# Altium footprint library ACTION_插件.PcbLib: 118 footprints (part 4 of 8)
Each footprint in its own frame and in the unit in brackets; x right, y up, seen from the top. Pads: shape width x height; smd on the part's side, far side on the other; paste and mask are expansions set on the pad; w line width, h text height; cw(c..) or ccw(c..) is an arc to the next point about the centre after c.
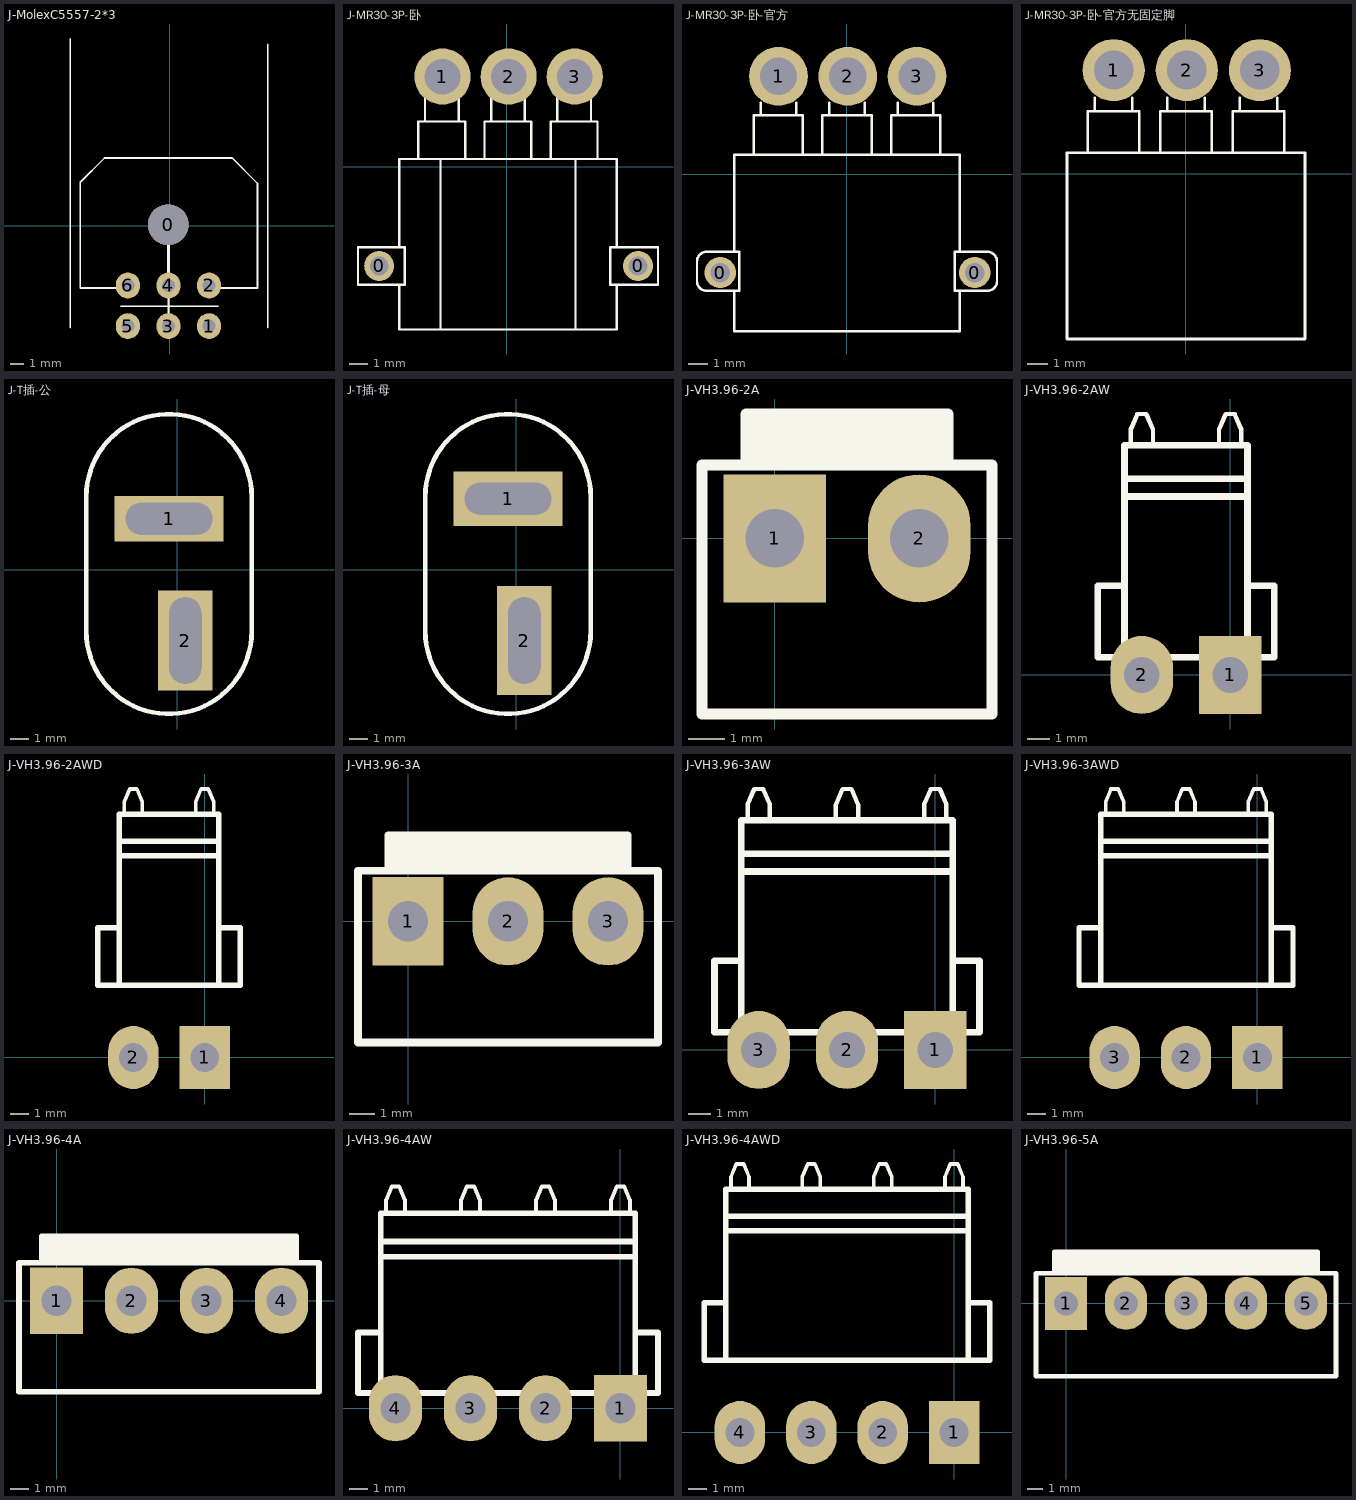
[diagram p3: the footprints below, top view; thin cyan lines are the x and y axes]

## J-MolexС5557-2*3 [mil]
pads (7):
  round 118.11 hole 118.11: 0(-4.72,3.7)
  oval 70x75.06 hole 38: 1(114.37,-291.3) 2(114.37,-173.19) 3(-3.72,-291.3) 4(-3.72,-173.19) 5(-121.83,-291.3) 6(-121.83,-173.19)
Top Overlay:
  lines w5: -289.72,-296.3 -289.72,543.7 ; -260.72,-180.3 -119.72,-180.3 -92.29,-180.3 ; -260.72,-177.3 -260.72,126.7 -189.72,197.7 75.28,197.7 ; -142.72,-233.3 140.28,-233.3 ; -3.72,-300.3 -3.72,-173.19 ; 74.28,197.7 75.28,197.7 ; 114.37,-180.3 255.37,-180.3 255.37,123.61 181.28,197.7 75.28,197.7 ; 285.28,-296.3 285.28,528.7
  lines w10: -3.72,-173.19 -3.72,-0.3

## J-MR30-3P-卧 [mm]
pads (5):
  round 1.6 hole 1: 0(-6.807,-5.309) 0(7.01,-5.309)
  round 3 hole 1.9: 1(-3.429,4.801) 2(0.102,4.801) 3(3.632,4.801)
Top Overlay:
  lines w0.127: -5.737,-6.3 -5.737,-8.7 -3.532,-8.7 ; -5.737,-4.3 -5.737,-0.7 -5.737,0.4 -3.532,0.4 ; -4.714,0.4 -4.714,2.4 -3.464,2.4 -2.214,2.4 -2.214,0.4 ; -4.364,2.4 -4.364,4.889 ; -2.564,2.4 -2.564,4.889 ; -1.184,0.4 -1.184,2.4 0.066,2.4 1.316,2.4 1.316,0.4 ; -0.834,2.4 -0.834,4.889 ; 0.966,2.4 0.966,4.889 ; 2.346,0.4 2.346,2.4 3.596,2.4 4.846,2.4 4.846,0.4 ; 2.696,2.4 2.696,4.889 ; 4.496,2.4 4.496,4.889 ; 5.873,-6.3 5.873,-8.7 3.668,-8.7 ; 5.873,-4.3 5.873,-0.7 5.873,0.4 3.668,0.4 ; -3.532,-8.7 -3.532,-1.63 -3.532,0 -3.532,0.4 ; -3.532,-8.7 3.668,-8.7 ; -3.532,0.4 3.668,0.4 ; 3.668,-8.7 3.668,-1.63 3.668,0 3.668,0.4 ; -7.937,-6.3 -7.937,-4.3 -5.446,-4.3 -5.446,-6.3 -7.937,-6.3 ; 5.521,-6.3 8.073,-6.3 8.073,-4.3 5.521,-4.3 5.521,-6.3
3D body "User Library-MR30PW-M.STEP": height 4.95, standoff -2.01, extent -7.933,-8.743 8.077,5.746

## J-MR30-3P-卧-官方 [mm]
pads (5):
  round 1.6 hole 1: 0(-6.452,-5.004) 0(6.528,-5.004)
  round 3 hole 1.9: 1(-3.48,5.004) 2(0.051,5.004) 3(3.581,5.004)
Top Overlay:
  circle w0.127: c-6.487,-4.939 r0.55
  circle w0.127: c6.513,-4.939 r0.55
  circle w0.127: c-6.487,-4.939 r0.5
  circle w0.127: c6.513,-4.939 r0.5
  lines w0.127: -5.737,-5.939 -5.737,-7.989 -3.487,-7.989 3.513,-7.989 5.763,-7.989 5.763,-5.939 ; -5.737,-3.939 -5.737,0.011 -5.737,1.011 -3.487,1.011 3.513,1.011 5.763,1.011 5.763,0.011 5.763,-3.939 ; -4.737,1.011 -4.737,3.011 -2.237,3.011 -2.237,1.011 ; -4.387,3.011 -4.387,3.661 ; -2.587,3.011 -2.587,3.661 ; -1.237,1.011 -1.237,3.011 1.263,3.011 1.263,1.011 ; -0.887,3.011 -0.887,3.661 ; 0.913,3.011 0.913,3.661 ; 2.263,1.011 2.263,3.011 4.763,3.011 4.763,1.011 ; 2.613,3.011 2.613,3.661 ; 4.413,3.011 4.413,3.661 ; -7.637,-5.439 ccw(c-7.137,-5.439) -7.137,-5.939 -5.477,-5.939 -5.477,-3.939 -7.137,-3.939 ccw(c-7.137,-4.439) -7.637,-4.439 -7.637,-5.439 ; 5.503,-5.939 7.163,-5.939 ccw(c7.163,-5.439) 7.663,-5.439 7.663,-4.439 ccw(c7.163,-4.439) 7.163,-3.939 5.503,-3.939 5.503,-5.939
3D body "MR30PW-M 3D DRAWING.STEP": height 5.1, standoff -1.85, extent -7.604,-8.016 7.696,5.934

## J-MR30-3P-卧-官方无固定脚 [mm]
pads (3):
  round 3 hole 1.9: 1(-3.48,5.004) 2(0.051,5.004) 3(3.581,5.004)
Top Overlay:
  lines w0.127: -5.737,-6.096 -5.737,0.011 -5.737,1.011 -3.487,1.011 3.513,1.011 5.763,1.011 5.763,0.011 5.763,-5.918 ; -5.737,-5.939 -5.737,-7.989 -3.487,-7.989 3.513,-7.989 5.763,-7.989 5.763,-5.939 ; -4.737,1.011 -4.737,3.011 -2.237,3.011 -2.237,1.011 ; -4.387,3.011 -4.387,3.661 ; -2.587,3.011 -2.587,3.661 ; -1.237,1.011 -1.237,3.011 1.263,3.011 1.263,1.011 ; -0.887,3.011 -0.887,3.661 ; 0.913,3.011 0.913,3.661 ; 2.263,1.011 2.263,3.011 4.763,3.011 4.763,1.011 ; 2.613,3.011 2.613,3.661 ; 4.413,3.011 4.413,3.661
3D body "MR30PW-M 3D DRAWING 214.STEP": height 5.1, standoff -1.85, extent -7.68,-8.001 7.62,5.949

## J-T插-公 [mm]
pads (2):
  rect 6x2.5 hole 1.778 slot 4.775 at 0 deg: 1(-0.45,2.8)
  rect 3x5.5 hole 1.778 slot 4.775 at 90 deg: 2(0.45,-3.9)
Top Overlay:
  lines w0.254: -5,-3.39 ccw(c-0.45,-3.39) 4.1,-3.39 4.1,4.01 ccw(c-0.45,4.01) -5,4.01 -5,-3.39
3D body "装配体2.STEP": height 11.35, standoff -3.75, extent -4.497,-7.468 3.303,8.932

## J-T插-母 [mm]
pads (2):
  rect 6x3 hole 1.778 slot 4.775 at 0 deg: 1(-0.45,3.9)
  rect 3x6 hole 1.778 slot 4.775 at 90 deg: 2(0.45,-3.9)
Top Overlay:
  lines w0.254: -5,-3.39 ccw(c-0.45,-3.39) 4.1,-3.39 4.1,4.01 ccw(c-0.45,4.01) -5,4.01 -5,-3.39
3D body "装配体2.STEP": height 11.35, standoff -3.75, extent -4.497,-7.468 3.303,8.932

## J-VH3.96-2A [mm]
pads (2):
  rect 2.8x3.5 hole 1.6: 1(0,0)
  oval 2.8x3.5 hole 1.6: 2(3.96,0)
Top Overlay:
  lines w0.3: -0.78,2 -0.78,3.4 4.74,3.4 4.74,2 ; -0.78,2.286 4.74,2.286 ; -0.78,2.413 4.74,2.413 ; -0.78,2.667 4.74,2.667 ; -0.78,2.921 4.74,2.921 ; -0.78,3.175 4.74,3.175 ; -1.98,-4.8 5.94,-4.8 5.94,2 -1.98,2 -1.98,-4.8
3D body "VH3.96-2A.STEP": height 14.6, standoff -3.6, extent -1.98,-4.8 5.94,3.6

## J-VH3.96-2AW [mm]
pads (2):
  rect 2.8x3.5 hole 1.6: 1(0,0)
  oval 2.8x3.5 hole 1.6: 2(-3.96,0)
Top Overlay:
  lines w0.2: -4.46,10.3 -4.46,11 -4.16,11.7 -3.76,11.7 -3.46,11 -3.46,10.3 ; -0.5,10.3 -0.5,11 -0.2,11.7 0.2,11.7 0.5,11 0.5,10.3
  lines w0.3: -4.74,0.8 -4.74,10.3 0.78,10.3 0.78,0.8 ; -4.74,4 -5.94,4 -5.94,0.8 1.98,0.8 1.98,4 0.78,4 ; -4.74,8 0.78,8 ; -4.74,8.8 0.78,8.8
3D body "VH3.96-2AW.STEP": height 8.4, standoff -3.6, extent -5.94,-0.55 1.98,11.7

## J-VH3.96-2AWD [mm]
pads (2):
  rect 2.8x3.5 hole 1.6: 1(0,0)
  oval 2.8x3.5 hole 1.6: 2(-3.96,0)
Top Overlay:
  lines w0.2: -4.46,13.5 -4.46,14.2 -4.16,14.9 -3.76,14.9 -3.46,14.2 -3.46,13.5 ; -0.5,13.5 -0.5,14.2 -0.2,14.9 0.2,14.9 0.5,14.2 0.5,13.5
  lines w0.3: -4.74,4 -4.74,13.5 0.78,13.5 0.78,4 ; -4.74,7.2 -5.94,7.2 -5.94,4 1.98,4 1.98,7.2 0.78,7.2 ; -4.74,11.2 0.78,11.2 ; -4.74,12 0.78,12
3D body "VH3.96-2AWD.STEP": height 8.4, standoff -3.6, extent -5.94,-0.55 1.98,14.9

## J-VH3.96-3A [mm]
pads (3):
  rect 2.8x3.5 hole 1.6: 1(0,0)
  oval 2.8x3.5 hole 1.6: 2(3.96,0) 3(7.92,0)
Top Overlay:
  lines w0.3: -0.78,2 -0.78,3.4 8.7,3.4 8.7,2 ; -0.78,2.286 8.7,2.286 ; -0.78,2.413 8.7,2.413 ; -0.78,2.667 8.7,2.667 ; -0.78,2.921 8.7,2.921 ; -0.78,3.175 8.7,3.175 ; -1.98,-4.8 -1.98,2 9.9,2 9.9,-4.8 -1.98,-4.8
3D body "VH3.96-3A.STEP": height 14.6, standoff -3.6, extent -1.98,-4.8 9.9,3.6

## J-VH3.96-3AW [mm]
pads (3):
  rect 2.8x3.5 hole 1.6: 1(0,0)
  oval 2.8x3.5 hole 1.6: 2(-3.96,0) 3(-7.92,0)
Top Overlay:
  lines w0.2: -8.42,10.3 -8.42,11 -8.12,11.7 -7.72,11.7 -7.42,11 -7.42,10.3 ; -4.46,10.3 -4.46,11 -4.16,11.7 -3.76,11.7 -3.46,11 -3.46,10.3 ; -0.5,10.3 -0.5,11 -0.2,11.7 0.2,11.7 0.5,11 0.5,10.3
  lines w0.3: -8.7,0.8 -8.7,10.3 0.78,10.3 0.78,0.8 ; -8.7,4 -9.9,4 -9.9,0.8 1.98,0.8 1.98,4 0.78,4 ; -8.7,8 0.78,8 ; -8.7,8.8 0.78,8.8
3D body "VH3.96-3AW.STEP": height 8.4, standoff -3.6, extent -9.9,-0.55 1.98,11.7

## J-VH3.96-3AWD [mm]
pads (3):
  rect 2.8x3.5 hole 1.6: 1(0,0)
  oval 2.8x3.5 hole 1.6: 2(-3.96,0) 3(-7.92,0)
Top Overlay:
  lines w0.2: -8.42,13.5 -8.42,14.2 -8.12,14.9 -7.72,14.9 -7.42,14.2 -7.42,13.5 ; -4.46,13.5 -4.46,14.2 -4.16,14.9 -3.76,14.9 -3.46,14.2 -3.46,13.5 ; -0.5,13.5 -0.5,14.2 -0.2,14.9 0.2,14.9 0.5,14.2 0.5,13.5
  lines w0.3: -8.7,4 -8.7,13.5 0.78,13.5 0.78,4 ; -8.7,7.2 -9.9,7.2 -9.9,4 1.98,4 1.98,7.2 0.78,7.2 ; -8.7,11.2 0.78,11.2 ; -8.7,12 0.78,12
3D body "VH3.96-3AW.STEP": height 8.4, standoff -3.6, extent -9.9,-0.55 1.98,14.9

## J-VH3.96-4A [mm]
pads (4):
  rect 2.8x3.5 hole 1.6: 1(0,0)
  oval 2.8x3.5 hole 1.6: 2(3.96,0) 3(7.92,0) 4(11.88,0)
Top Overlay:
  lines w0.3: -0.78,2 -0.78,3.4 12.66,3.4 12.66,2 ; -0.78,2.159 12.66,2.159 ; -0.78,2.413 12.66,2.413 ; -0.78,2.667 12.66,2.667 ; -0.78,2.921 12.66,2.921 ; -0.78,3.175 12.66,3.175 ; -1.98,-4.8 -1.98,2 13.86,2 13.86,-4.8 -1.98,-4.8
3D body "VH3.96-4A.STEP": height 14.6, standoff -3.6, extent -1.98,-4.8 13.86,3.6

## J-VH3.96-4AW [mm]
pads (4):
  rect 2.8x3.5 hole 1.6: 1(0,0)
  oval 2.8x3.5 hole 1.6: 2(-3.96,0) 3(-7.92,0) 4(-11.88,0)
Top Overlay:
  lines w0.2: -12.38,10.3 -12.38,11 -12.08,11.7 -11.68,11.7 -11.38,11 -11.38,10.3 ; -8.42,10.3 -8.42,11 -8.12,11.7 -7.72,11.7 -7.42,11 -7.42,10.3 ; -4.46,10.3 -4.46,11 -4.16,11.7 -3.76,11.7 -3.46,11 -3.46,10.3 ; -0.5,10.3 -0.5,11 -0.2,11.7 0.2,11.7 0.5,11 0.5,10.3
  lines w0.3: -12.66,0.8 -12.66,10.3 0.78,10.3 0.78,0.8 ; -12.66,4 -13.86,4 -13.86,0.8 1.98,0.8 1.98,4 0.78,4 ; -12.66,8 0.78,8 ; -12.66,8.8 0.78,8.8
3D body "VH3.96-4AW.STEP": height 8.4, standoff -3.6, extent -13.86,-0.55 1.98,11.7

## J-VH3.96-4AWD [mm]
pads (4):
  rect 2.8x3.5 hole 1.6: 1(0,0)
  oval 2.8x3.5 hole 1.6: 2(-3.96,0) 3(-7.92,0) 4(-11.88,0)
Top Overlay:
  lines w0.2: -12.38,13.5 -12.38,14.2 -12.08,14.9 -11.68,14.9 -11.38,14.2 -11.38,13.5 ; -8.42,13.5 -8.42,14.2 -8.12,14.9 -7.72,14.9 -7.42,14.2 -7.42,13.5 ; -4.46,13.5 -4.46,14.2 -4.16,14.9 -3.76,14.9 -3.46,14.2 -3.46,13.5 ; -0.5,13.5 -0.5,14.2 -0.2,14.9 0.2,14.9 0.5,14.2 0.5,13.5
  lines w0.3: -12.66,4 -12.66,13.5 0.78,13.5 0.78,4 ; -12.66,7.2 -13.86,7.2 -13.86,4 1.98,4 1.98,7.2 0.78,7.2 ; -12.66,11.2 0.78,11.2 ; -12.66,12 0.78,12
3D body "VH3.96-4AW.STEP": height 8.4, standoff -3.6, extent -13.86,-0.55 1.98,14.9

## J-VH3.96-5A [mm]
pads (5):
  rect 2.8x3.5 hole 1.6: 1(0,0)
  oval 2.8x3.5 hole 1.6: 2(3.96,0) 3(7.92,0) 4(11.88,0) 5(15.84,0)
Top Overlay:
  lines w0.3: -0.78,2 -0.78,3.4 16.62,3.4 16.62,2 ; -0.78,2.159 16.62,2.159 ; -0.78,2.413 16.62,2.413 ; -0.78,2.667 16.62,2.667 ; -0.78,2.921 16.62,2.921 ; -0.78,3.175 16.62,3.175 ; -1.98,-4.8 17.82,-4.8 17.82,2 -1.98,2 -1.98,-4.8
3D body "VH3.96-5A.STEP": height 14.6, standoff -3.6, extent -1.98,-4.8 17.82,3.6